# Altium footprint library Components.PcbLib: 111 footprints (part 6 of 7)
Each footprint in its own frame and in the unit in brackets; x right, y up, seen from the top. Pads: shape width x height; smd on the part's side, far side on the other; paste and mask are expansions set on the pad; w line width, h text height; cw(c..) or ccw(c..) is an arc to the next point about the centre after c.
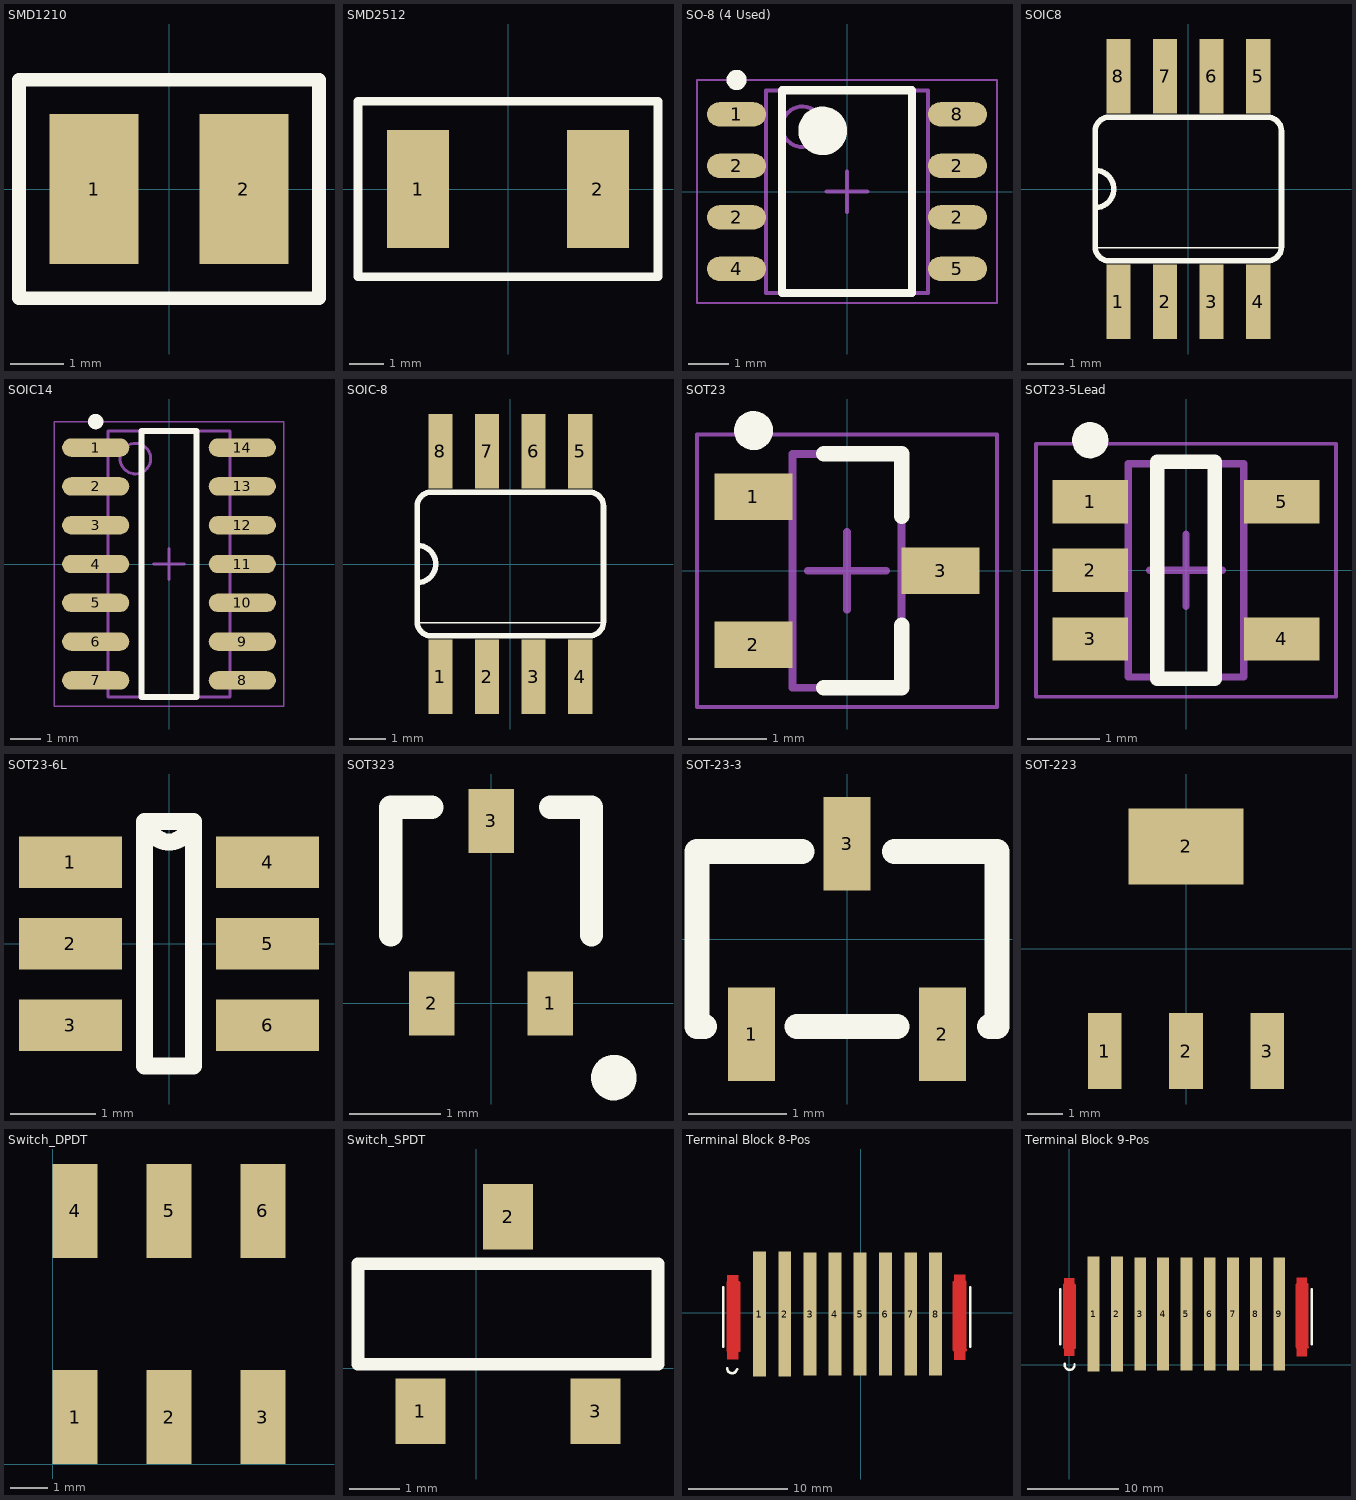
[diagram p5: the footprints below, top view; thin cyan lines are the x and y axes]

## SMD1210 [mil]
pads (2):
  rect 65x110 smd: 1(-55,0) 2(55,0)
Top Overlay:
  lines w10: -110,-80 -110,57.5 -110,80 110,80 110,-80 -110,-80
3D body "CAPC-1210-T1.8-BN.stp": height 70.87, standoff 0, extent -68.89,-53.14 68.9,53.16

## SMD2512 [mm]
pads (2):
  rect 1.8x3.4 smd: 1(-2.6,0) 2(2.6,0)
Top Overlay:
  lines w0.254: -4.34,-2.54 -4.34,0 -4.34,2.54 4.34,2.54 4.34,-2.54 -4.34,-2.54
3D body "WSLF2512 (0.001 ohm).stp": height 0.81, standoff 0, extent -3.175,-1.6 3.175,1.575

## SO-8 (4 Used) [mm] "SOIC, 8-Leads, Body 4.90x3.90mm, Pitch 1.27mm, IPC Medium Density"
height 1.75
pads (8):
  oval 1.45x0.6 smd: 1(-2.725,1.905) 2(-2.725,-0.635) 2(-2.725,0.635) 2(2.725,-0.635) 2(2.725,0.635) 4(-2.725,-1.905) 5(2.725,-1.905) 8(2.725,1.905)
Top Overlay:
  circle w0.6: c-0.6,1.5 r0.3
  circle w0.25: c-2.725,2.755 r0.125
  lines w0.2: -1.6,-2.5 1.6,-2.5 1.6,2.5 -1.6,2.5 -1.6,-2.5
Mechanical 13:
  circle w0.1: c-1.1,1.6 r0.5
  lines w0.1: -2,-2.5 2,-2.5 2,2.5 -2,2.5 -2,-2.5
Mechanical 15:
  lines w0.05: -3.7,-2.75 3.7,-2.75 3.7,2.75 -3.7,2.75 -3.7,-2.75
  lines w0.1: -0.5,0 0.5,0 ; 0,-0.5 0,0.5
3D body: height 1.75, standoff 0.1, extent -2,-2.5 2,2.5

## SOIC8 [mil]
pads (8):
  rect 26x80 smd mask+3: 1(-75,-121) 2(-25,-121) 3(25,-121) 4(75,-121) 5(75,121) 6(25,121) 7(-25,121) 8(-75,121)
Top Overlay:
  lines w2: -100,-63 100,-63
  lines w6: -100,-20 ccw(c-100,0) -100,20 ; -100,-20 -100,-62 ccw(c-85,-62) -85,-77 85,-77 ccw(c85,-62) 100,-62 100,62 ccw(c85,62) 85,77 -85,77 ccw(c-85,62) -100,62 -100,20 ; -100,-20 -100,20
3D body "SOIC-8.stp": height 68.9, standoff 0, extent -96.46,-118.11 96.45,118.11

## SOIC14 [mm] "SOIC, 14-Leads, Body 8.65x3.90mm, Pitch 1.27mm, IPC Medium Density"
height 1.75
pads (14):
  oval 2.2x0.6 smd: 1(-2.4,3.81) 2(-2.4,2.54) 3(-2.4,1.27) 4(-2.4,0) 5(-2.4,-1.27) 6(-2.4,-2.54) 7(-2.4,-3.81) 8(2.4,-3.81) 9(2.4,-2.54) 10(2.4,-1.27) 11(2.4,0) 12(2.4,1.27) 13(2.4,2.54) 14(2.4,3.81)
Top Overlay:
  circle w0.25: c-2.4,4.66 r0.125
  lines w0.2: -0.9,-4.35 -0.9,4.35 0.9,4.35 0.9,-4.35 -0.9,-4.35
Mechanical 13:
  circle w0.1: c-1.1,3.45 r0.5
  lines w0.1: -2,-4.35 -2,4.35 2,4.35 2,-4.35 -2,-4.35
Mechanical 15:
  lines w0.05: -3.75,-4.65 -3.75,4.65 3.75,4.65 3.75,-4.65 -3.75,-4.65
  lines w0.1: -0.5,0 0.5,0 ; 0,-0.5 0,0.5
3D body "soic-14.stp": height 1.62, standoff 0.02, extent -2.997,-4.318 3.048,4.318

## SOIC-8 [mil]
pads (8):
  rect 26x80 smd mask+3: 1(-75,-121) 2(-25,-121) 3(25,-121) 4(75,-121) 5(75,121) 6(25,121) 7(-25,121) 8(-75,121)
Top Overlay:
  lines w2: -100,-63 100,-63
  lines w6: -100,-20 ccw(c-100,0) -100,20 ; -100,-20 -100,20 ; -100,-20 -100,-62 ccw(c-85,-62) -85,-77 85,-77 ccw(c85,-62) 100,-62 100,62 ccw(c85,62) 85,77 -85,77 ccw(c-85,62) -100,62 -100,20
3D body "SOIC-8.stp": height 68.9, standoff 0, extent -96.46,-118.11 96.45,118.11

## SOT23 [mm] "SOT23, 3-Leads, Body 2.90x2.45mm, Pitch 0.95mm, IPC Medium Density"
height 1.1
pads (3):
  rect 1x0.6 smd: 1(-1.2,0.95) 2(-1.2,-0.95) 3(1.2,0)
Top Overlay:
  circle w0.25: c-1.2,1.8 r0.125
  lines w0.2: -0.3,-1.5 0.7,-1.5 0.7,-0.7 ; -0.3,1.5 0.7,1.5 0.7,0.7
Mechanical 13:
  lines w0.1: -0.7,-1.5 -0.7,1.5 0.7,1.5 0.7,-1.5 -0.7,-1.5
Mechanical 15:
  lines w0.05: -1.925,-1.75 -1.925,1.75 1.925,1.75 1.925,-1.75 -1.925,-1.75
  lines w0.1: -0.5,0 0.5,0 ; 0,-0.5 0,0.5
3D body "SOT23_3.stp": height 1, standoff 0, extent -1.257,-1.492 1.293,1.508

## SOT23-5Lead [mm] "SOT23, 5-Leads, Body 2.95x2.80mm, Pitch 0.95mm, IPC Medium Density"
height 1.45
pads (5):
  rect 1.05x0.6 smd: 1(-1.325,0.95) 2(-1.325,0) 3(-1.325,-0.95) 4(1.325,-0.95) 5(1.325,0.95)
Top Overlay:
  circle w0.25: c-1.325,1.8 r0.125
  lines w0.2: -0.4,-1.5 -0.4,1.5 0.4,1.5 0.4,-1.5 -0.4,-1.5
Mechanical 13:
  lines w0.1: -0.8,-1.475 0.8,-1.475 0.8,1.475 -0.8,1.475 -0.8,-1.475
Mechanical 15:
  lines w0.05: -2.075,-1.75 2.075,-1.75 2.075,1.75 -2.075,1.75 -2.075,-1.75
  lines w0.1: -0.5,0 0.5,0 ; 0,-0.5 0,0.5
3D body "SOT23_5.stp": height 0.92, standoff 0.01, extent -1.655,-1.501 1.549,1.499

## SOT23-6L [mm] "ESDA6V1BC6"
pads (6):
  rect 1.2x0.6 smd: 1(-1.15,0.95) 2(-1.15,0) 3(-1.15,-0.95) 4(1.15,0.95) 5(1.15,0) 6(1.15,-0.95)
Top Overlay:
  lines w0.2: -0.285,-1.425 0.285,-1.425 0.285,1.425 -0.238,1.425 ccw(c0,1.425) 0.238,1.425 -0.285,1.425 -0.285,-1.425
3D body: height 1.45, standoff 0.1, extent -0.875,-1.525 0.875,1.525

## SOT323 [mm] "SOT23, 3-Leads, Body 2.00x2.10mm, Pitch 0.65mm, IPC Medium Density"
height 1.1
pads (3):
  rect 0.5x0.7 smd: 1(0.65,0) 2(-0.65,0) 3(0,2)
Top Overlay:
  circle w0.25: c1.346,-0.813 r0.125
  lines w0.254: -1.1,0.75 -1.1,2.15 -0.65,2.15 ; 0.65,2.15 1.1,2.15 1.1,0.75
3D body "SOT323.STEP": height 1.1, standoff 0, extent -1.1,-0.132 1.1,2.113

## SOT-23-3 [mm] "ESDCAN24-2BLY"
height 1.499
pads (3):
  rect 0.48x0.95 smd mask+0.076: 1(-0.97,-0.97) 2(0.97,-0.97) 3(0,0.97)
Top Overlay:
  lines w0.254: -1.448,-0.889 -1.524,-0.889 -1.524,0.889 -0.457,0.889 ; -0.508,-0.889 0.508,-0.889 ; 0.483,0.889 1.524,0.889 1.524,-0.889 1.448,-0.889
3D body: height 1.5, standoff 0.1, extent -1.52,-0.875 1.52,0.875

## SOT-223 [mm]
pads (4):
  rect 0.95x2.15 smd mask+0.076: 1(-2.3,-2.9) 2(0,-2.9) 3(2.3,-2.9)
  rect 3.25x2.15 smd mask+0.076: 2(0,2.9)
3D body "TO-261AA.stp": height 1.8, standoff 0, extent -3.35,-3.65 3.35,3.65

## Switch_DPDT [mm]
pads (6):
  rect 1.2x2.5 smd: 1(0.6,1.25) 2(3.1,1.25) 3(5.6,1.25) 4(0.6,6.75) 5(3.1,6.75) 6(5.6,6.75)
3D body "Switch_DPDT.stp": height 5.65, standoff -0.2, extent -1.4,0.45 7.6,7.45

## Switch_SPDT [mm]
height 2.5
pads (3):
  rect 1x1.3 smd: 1(-1.118,-0.864) 2(0.635,3.023) 3(2.388,-0.864)
Top Overlay:
  lines w0.254: -2.362,0.076 3.632,0.076 3.632,2.083 -2.362,2.083 -2.362,0.076
3D body "CJS-1201TB.stp": height 2.48, standoff -0.04, extent -2.348,-1.089 3.652,3.111

## Terminal Block 8-Pos [mm]
height 11
pads (8):
  rect 1.3x12.6 smd: 1(-10.2,-0.122) 2(-7.65,-0.122)
  rect 1.3x12.4 smd: 3(-5.1,-0.122) 4(-2.6,-0.122) 5(-0.05,-0.122) 6(2.5,-0.122) 7(5.05,-0.122) 8(7.55,-0.122)
Top Layer:
  rectangle: 9.409,-4.772 10.559,3.878
  rectangle: -13.45,-4.722 -12.3,3.828
  lines w0.254: -13.4,-3.822 -13.4,3.078 -12.3,3.078 -12.25,3.028 -12.25,-3.822 -13.4,-3.822 ; 9.409,-3.722 9.459,-3.772 10.609,-3.772 10.559,-3.722 10.559,3.128 10.509,3.078 9.409,3.078 9.409,-3.722
Top Overlay:
  lines w0.254: -13.85,-3.422 -13.85,2.578 ; -13.454,-5.612 ccw(c-12.954,-5.588) -12.462,-5.683 ; 11.059,-3.422 11.059,2.578

## Terminal Block 9-Pos [mm]
height 11
pads (9):
  rect 1.3x12.6 smd: 1(2.652,5.568) 2(5.202,5.568)
  rect 1.3x12.4 smd: 3(7.752,5.568) 4(10.252,5.568) 5(12.802,5.568) 6(15.352,5.568) 7(17.902,5.568) 8(20.402,5.568) 9(22.952,5.568)
Top Layer:
  rectangle: -0.598,0.968 0.552,9.518
  rectangle: 24.852,0.918 26.002,9.568
  lines w0.254: -0.548,1.868 0.602,1.868 0.602,8.718 0.552,8.768 -0.548,8.768 -0.548,1.868 ; 24.852,1.968 24.852,8.768 25.952,8.768 26.002,8.818 26.002,1.968 26.052,1.918 24.902,1.918 24.852,1.968
Top Overlay:
  lines w0.254: -0.998,2.268 -0.998,8.268 ; -0.494,0.133 ccw(c0.025,0) 0.554,0.085 ; 26.502,2.268 26.502,8.268